# Altium schematic symbol library jlcpcb_2025_04_capacitors_extended_0603.schlib: 3668 symbols (part 19 of 20) (continued)
## TCC0603X5R185K160CT
designator C?  Capacitance: 1.8uF  (hidden comment: *)
Capacitor, Ceramic (MLCC), 1.8uF, ±10%, 16V, X5R, ±10%, SMD 0603; Manufacturer: CCTC; Manufacturer Part Number: TCC0603X5R185K160CT; Package Size: 0603; JLCPCB Basic Part: No; JLCPCB Part Number: C7393894; Supplier 1: LCSC; Category: Capacitors - MLCC; Supplier Part Number 1: C7393894; Tolerance: ±10%; Voltage Rating: 16V; Temperature Coefficient: X5R; RoHS: Yes; ComponentLink1Description: Datasheet; ComponentLink1URL: https://wmsc.lcsc.com/wmsc/upload/file/pdf/v2/lcsc/2306211554_CCTC-TCC0603X5R185K160CT_C7393894.pdf; ComponentLink2Description: JLCPCB Part URL; ComponentLink2URL: https://jlcpcb.com/partdetail/C7393894; ComponentLink3Description: LCSC Part URL; ComponentLink3URL: https://lcsc.com/product-detail/Multilayer-Ceramic-Capacitors-MLCC---SMD-SMT_CCTC-CCTC-TCC0603X5R185K160CT_C7393894.html
footprint CAP-0603 (0603 (1608M) Capacitor)
pins: 1, 2

## TCC0603X5R224M250CT
designator C?  Capacitance: 220nF  (hidden comment: *)
Capacitor, Ceramic (MLCC), 220nF, ±20%, 25V, X5R, ±20%, SMD 0603; Manufacturer: CCTC; Manufacturer Part Number: TCC0603X5R224M250CT; Package Size: 0603; JLCPCB Basic Part: No; JLCPCB Part Number: C713508; Supplier 1: LCSC; Category: Capacitors - MLCC; Supplier Part Number 1: C713508; Tolerance: ±20%; Voltage Rating: 25V; Temperature Coefficient: X5R; RoHS: Yes; ComponentLink1Description: Datasheet; ComponentLink1URL: https://wmsc.lcsc.com/wmsc/upload/file/pdf/v2/lcsc/2304140030_CCTC-TCC0603X5R224M250CT_C713508.pdf; ComponentLink2Description: JLCPCB Part URL; ComponentLink2URL: https://jlcpcb.com/partdetail/C713508; ComponentLink3Description: LCSC Part URL; ComponentLink3URL: https://lcsc.com/product-detail/Multilayer-Ceramic-Capacitors-MLCC---SMD-SMT_CCTC-CCTC-TCC0603X5R224M250CT_C713508.html
footprint CAP-0603 (0603 (1608M) Capacitor)
pins: 1, 2

## TCC0603X5R225K6R3CT
designator C?  Capacitance: 2.2uF  (hidden comment: *)
Capacitor, Ceramic (MLCC), 2.2uF, ±10%, 6.3V, X5R, ±10%, SMD 0603; Manufacturer: CCTC; Manufacturer Part Number: TCC0603X5R225K6R3CT; Package Size: 0603; JLCPCB Basic Part: No; JLCPCB Part Number: C380322; Supplier 1: LCSC; Category: Capacitors - MLCC; Supplier Part Number 1: C380322; Tolerance: ±10%; Voltage Rating: 6.3V; Temperature Coefficient: X5R; RoHS: Yes; ComponentLink1Description: Datasheet; ComponentLink1URL: https://wmsc.lcsc.com/wmsc/upload/file/pdf/v2/lcsc/2304140030_CCTC-TCC0603X5R225K6R3CT_C380322.pdf; ComponentLink2Description: JLCPCB Part URL; ComponentLink2URL: https://jlcpcb.com/partdetail/C380322; ComponentLink3Description: LCSC Part URL; ComponentLink3URL: https://lcsc.com/product-detail/Multilayer-Ceramic-Capacitors-MLCC---SMD-SMT_CCTC-CCTC-TCC0603X5R225K6R3CT_C380322.html
footprint CAP-0603 (0603 (1608M) Capacitor)
pins: 1, 2

## TCC0603X5R225K100CT
designator C?  Capacitance: 2.2uF  (hidden comment: *)
Capacitor, Ceramic (MLCC), 2.2uF, ±10%, 10V, X5R, ±10%, SMD 0603; Manufacturer: CCTC; Manufacturer Part Number: TCC0603X5R225K100CT; Package Size: 0603; JLCPCB Basic Part: No; JLCPCB Part Number: C380319; Supplier 1: LCSC; Category: Capacitors - MLCC; Supplier Part Number 1: C380319; Tolerance: ±10%; Voltage Rating: 10V; Temperature Coefficient: X5R; RoHS: Yes; ComponentLink1Description: Datasheet; ComponentLink1URL: https://wmsc.lcsc.com/wmsc/upload/file/pdf/v2/lcsc/2304140030_CCTC-TCC0603X5R225K100CT_C380319.pdf; ComponentLink2Description: JLCPCB Part URL; ComponentLink2URL: https://jlcpcb.com/partdetail/C380319; ComponentLink3Description: LCSC Part URL; ComponentLink3URL: https://lcsc.com/product-detail/Multilayer-Ceramic-Capacitors-MLCC---SMD-SMT_CCTC-CCTC-TCC0603X5R225K100CT_C380319.html
footprint CAP-0603 (0603 (1608M) Capacitor)
pins: 1, 2

## TCC0603X5R225K160CT
designator C?  Capacitance: 2.2uF  (hidden comment: *)
Capacitor, Ceramic (MLCC), 2.2uF, ±10%, 16V, X5R, ±10%, SMD 0603; Manufacturer: CCTC; Manufacturer Part Number: TCC0603X5R225K160CT; Package Size: 0603; JLCPCB Basic Part: No; JLCPCB Part Number: C380320; Supplier 1: LCSC; Category: Capacitors - MLCC; Supplier Part Number 1: C380320; Tolerance: ±10%; Voltage Rating: 16V; Temperature Coefficient: X5R; RoHS: Yes; ComponentLink1Description: Datasheet; ComponentLink1URL: https://wmsc.lcsc.com/wmsc/upload/file/pdf/v2/lcsc/2304140030_CCTC-TCC0603X5R225K160CT_C380320.pdf; ComponentLink2Description: JLCPCB Part URL; ComponentLink2URL: https://jlcpcb.com/partdetail/C380320; ComponentLink3Description: LCSC Part URL; ComponentLink3URL: https://lcsc.com/product-detail/Multilayer-Ceramic-Capacitors-MLCC---SMD-SMT_CCTC-CCTC-TCC0603X5R225K160CT_C380320.html
footprint CAP-0603 (0603 (1608M) Capacitor)
pins: 1, 2

## TCC0603X5R225K250CT
designator C?  Capacitance: 2.2uF  (hidden comment: *)
Capacitor, Ceramic (MLCC), 2.2uF, ±10%, 25V, X5R, ±10%, SMD 0603; Manufacturer: CCTC; Manufacturer Part Number: TCC0603X5R225K250CT; Package Size: 0603; JLCPCB Basic Part: No; JLCPCB Part Number: C380321; Supplier 1: LCSC; Category: Capacitors - MLCC; Supplier Part Number 1: C380321; Tolerance: ±10%; Voltage Rating: 25V; Temperature Coefficient: X5R; RoHS: Yes; ComponentLink1Description: Datasheet; ComponentLink1URL: https://wmsc.lcsc.com/wmsc/upload/file/pdf/v2/lcsc/2304140030_CCTC-TCC0603X5R225K250CT_C380321.pdf; ComponentLink2Description: JLCPCB Part URL; ComponentLink2URL: https://jlcpcb.com/partdetail/C380321; ComponentLink3Description: LCSC Part URL; ComponentLink3URL: https://lcsc.com/product-detail/Multilayer-Ceramic-Capacitors-MLCC---SMD-SMT_CCTC-CCTC-TCC0603X5R225K250CT_C380321.html
footprint CAP-0603 (0603 (1608M) Capacitor)
pins: 1, 2

## TCC0603X5R225M160CT
designator C?  Capacitance: 2.2uF  (hidden comment: *)
Capacitor, Ceramic (MLCC), 2.2uF, ±20%, 16V, X5R, ±20%, SMD 0603; Manufacturer: CCTC; Manufacturer Part Number: TCC0603X5R225M160CT; Package Size: 0603; JLCPCB Basic Part: No; JLCPCB Part Number: C5360777; Supplier 1: LCSC; Category: Capacitors - MLCC; Supplier Part Number 1: C5360777; Tolerance: ±20%; Voltage Rating: 16V; Temperature Coefficient: X5R; RoHS: Yes; ComponentLink1Description: Datasheet; ComponentLink1URL: https://wmsc.lcsc.com/wmsc/upload/file/pdf/v2/lcsc/2302141837_CCTC-TCC0603X5R225M160CT_C5360777.pdf; ComponentLink2Description: JLCPCB Part URL; ComponentLink2URL: https://jlcpcb.com/partdetail/C5360777; ComponentLink3Description: LCSC Part URL; ComponentLink3URL: https://lcsc.com/product-detail/Multilayer-Ceramic-Capacitors-MLCC---SMD-SMT_CCTC-CCTC-TCC0603X5R225M160CT_C5360777.html
footprint CAP-0603 (0603 (1608M) Capacitor)
pins: 1, 2

## TCC0603X5R335M250CT
designator C?  Capacitance: 3.3uF  (hidden comment: *)
Capacitor, Ceramic (MLCC), 3.3uF, 25V, X5R, SMD 0603; Manufacturer: CCTC; Manufacturer Part Number: TCC0603X5R335M250CT; Package Size: 0603; JLCPCB Basic Part: No; JLCPCB Part Number: C5360803; Supplier 1: LCSC; Category: Capacitors - MLCC; Supplier Part Number 1: C5360803; Voltage Rating: 25V; Temperature Coefficient: X5R; RoHS: Yes; ComponentLink1Description: Datasheet; ComponentLink1URL: https://wmsc.lcsc.com/wmsc/upload/file/pdf/v2/lcsc/2302141837_CCTC-TCC0603X5R335M250CT_C5360803.pdf; ComponentLink2Description: JLCPCB Part URL; ComponentLink2URL: https://jlcpcb.com/partdetail/C5360803; ComponentLink3Description: LCSC Part URL; ComponentLink3URL: https://lcsc.com/product-detail/Multilayer-Ceramic-Capacitors-MLCC---SMD-SMT_CCTC-CCTC-TCC0603X5R335M250CT_C5360803.html
footprint CAP-0603 (0603 (1608M) Capacitor)
pins: 1, 2

## TCC0603X5R475K6R3CT
designator C?  Capacitance: 4.7uF  (hidden comment: *)
Capacitor, Ceramic (MLCC), 4.7uF, ±10%, 6.3V, X5R, ±10%, SMD 0603; Manufacturer: CCTC; Manufacturer Part Number: TCC0603X5R475K6R3CT; Package Size: 0603; JLCPCB Basic Part: No; JLCPCB Part Number: C380326; Supplier 1: LCSC; Category: Capacitors - MLCC; Supplier Part Number 1: C380326; Tolerance: ±10%; Voltage Rating: 6.3V; Temperature Coefficient: X5R; RoHS: Yes; ComponentLink1Description: Datasheet; ComponentLink1URL: https://wmsc.lcsc.com/wmsc/upload/file/pdf/v2/lcsc/2304140030_CCTC-TCC0603X5R475K6R3CT_C380326.pdf; ComponentLink2Description: JLCPCB Part URL; ComponentLink2URL: https://jlcpcb.com/partdetail/C380326; ComponentLink3Description: LCSC Part URL; ComponentLink3URL: https://lcsc.com/product-detail/Multilayer-Ceramic-Capacitors-MLCC---SMD-SMT_CCTC-CCTC-TCC0603X5R475K6R3CT_C380326.html
footprint CAP-0603 (0603 (1608M) Capacitor)
pins: 1, 2

## TCC0603X5R475K100CT
designator C?  Capacitance: 4.7uF  (hidden comment: *)
Capacitor, Ceramic (MLCC), 4.7uF, ±10%, 10V, X5R, ±10%, SMD 0603; Manufacturer: CCTC; Manufacturer Part Number: TCC0603X5R475K100CT; Package Size: 0603; JLCPCB Basic Part: No; JLCPCB Part Number: C380324; Supplier 1: LCSC; Category: Capacitors - MLCC; Supplier Part Number 1: C380324; Tolerance: ±10%; Voltage Rating: 10V; Temperature Coefficient: X5R; RoHS: Yes; ComponentLink1Description: Datasheet; ComponentLink1URL: https://wmsc.lcsc.com/wmsc/upload/file/pdf/v2/lcsc/2304140030_CCTC-TCC0603X5R475K100CT_C380324.pdf; ComponentLink2Description: JLCPCB Part URL; ComponentLink2URL: https://jlcpcb.com/partdetail/C380324; ComponentLink3Description: LCSC Part URL; ComponentLink3URL: https://lcsc.com/product-detail/Multilayer-Ceramic-Capacitors-MLCC---SMD-SMT_CCTC-CCTC-TCC0603X5R475K100CT_C380324.html
footprint CAP-0603 (0603 (1608M) Capacitor)
pins: 1, 2

## TCC0603X5R475K160CT
designator C?  Capacitance: 4.7uF  (hidden comment: *)
Capacitor, Ceramic (MLCC), 4.7uF, ±10%, 16V, X5R, ±10%, SMD 0603; Manufacturer: CCTC; Manufacturer Part Number: TCC0603X5R475K160CT; Package Size: 0603; JLCPCB Basic Part: No; JLCPCB Part Number: C380325; Supplier 1: LCSC; Category: Capacitors - MLCC; Supplier Part Number 1: C380325; Tolerance: ±10%; Voltage Rating: 16V; Temperature Coefficient: X5R; RoHS: Yes; ComponentLink1Description: Datasheet; ComponentLink1URL: https://wmsc.lcsc.com/wmsc/upload/file/pdf/v2/lcsc/2304140030_CCTC-TCC0603X5R475K160CT_C380325.pdf; ComponentLink2Description: JLCPCB Part URL; ComponentLink2URL: https://jlcpcb.com/partdetail/C380325; ComponentLink3Description: LCSC Part URL; ComponentLink3URL: https://lcsc.com/product-detail/Multilayer-Ceramic-Capacitors-MLCC---SMD-SMT_CCTC-CCTC-TCC0603X5R475K160CT_C380325.html
footprint CAP-0603 (0603 (1608M) Capacitor)
pins: 1, 2

## TCC0603X5R475K250CT
designator C?  Capacitance: 4.7uF  (hidden comment: *)
Capacitor, Ceramic (MLCC), 4.7uF, ±10%, 25V, X5R, ±10%, SMD 0603; Manufacturer: CCTC; Manufacturer Part Number: TCC0603X5R475K250CT; Package Size: 0603; JLCPCB Basic Part: No; JLCPCB Part Number: C5360844; Supplier 1: LCSC; Category: Capacitors - MLCC; Supplier Part Number 1: C5360844; Tolerance: ±10%; Voltage Rating: 25V; Temperature Coefficient: X5R; RoHS: Yes; ComponentLink1Description: Datasheet; ComponentLink1URL: https://wmsc.lcsc.com/wmsc/upload/file/pdf/v2/lcsc/2302141837_CCTC-TCC0603X5R475K250CT_C5360844.pdf; ComponentLink2Description: JLCPCB Part URL; ComponentLink2URL: https://jlcpcb.com/partdetail/C5360844; ComponentLink3Description: LCSC Part URL; ComponentLink3URL: https://lcsc.com/product-detail/Multilayer-Ceramic-Capacitors-MLCC---SMD-SMT_CCTC-CCTC-TCC0603X5R475K250CT_C5360844.html
footprint CAP-0603 (0603 (1608M) Capacitor)
pins: 1, 2

## TCC0603X5R475M160CT
designator C?  Capacitance: 4.7uF  (hidden comment: *)
Capacitor, Ceramic (MLCC), 4.7uF, ±20%, 16V, X5R, ±20%, SMD 0603; Manufacturer: CCTC; Manufacturer Part Number: TCC0603X5R475M160CT; Package Size: 0603; JLCPCB Basic Part: No; JLCPCB Part Number: C7393897; Supplier 1: LCSC; Category: Capacitors - MLCC; Supplier Part Number 1: C7393897; Tolerance: ±20%; Voltage Rating: 16V; Temperature Coefficient: X5R; RoHS: Yes; ComponentLink1Description: Datasheet; ComponentLink1URL: https://wmsc.lcsc.com/wmsc/upload/file/pdf/v2/lcsc/2306211554_CCTC-TCC0603X5R475M160CT_C7393897.pdf; ComponentLink2Description: JLCPCB Part URL; ComponentLink2URL: https://jlcpcb.com/partdetail/C7393897; ComponentLink3Description: LCSC Part URL; ComponentLink3URL: https://lcsc.com/product-detail/Multilayer-Ceramic-Capacitors-MLCC---SMD-SMT_CCTC-CCTC-TCC0603X5R475M160CT_C7393897.html
footprint CAP-0603 (0603 (1608M) Capacitor)
pins: 1, 2

## TCC0603X5R684M160CT
designator C?  Capacitance: 680nF  (hidden comment: *)
Capacitor, Ceramic (MLCC), 680nF, 16V, X5R, SMD 0603; Manufacturer: CCTC; Manufacturer Part Number: TCC0603X5R684M160CT; Package Size: 0603; JLCPCB Basic Part: No; JLCPCB Part Number: C5360787; Supplier 1: LCSC; Category: Capacitors - MLCC; Supplier Part Number 1: C5360787; Voltage Rating: 16V; Temperature Coefficient: X5R; RoHS: Yes; ComponentLink1Description: Datasheet; ComponentLink1URL: https://wmsc.lcsc.com/wmsc/upload/file/pdf/v2/lcsc/2302141837_CCTC-TCC0603X5R684M160CT_C5360787.pdf; ComponentLink2Description: JLCPCB Part URL; ComponentLink2URL: https://jlcpcb.com/partdetail/C5360787; ComponentLink3Description: LCSC Part URL; ComponentLink3URL: https://lcsc.com/product-detail/Multilayer-Ceramic-Capacitors-MLCC---SMD-SMT_CCTC-CCTC-TCC0603X5R684M160CT_C5360787.html
footprint CAP-0603 (0603 (1608M) Capacitor)
pins: 1, 2

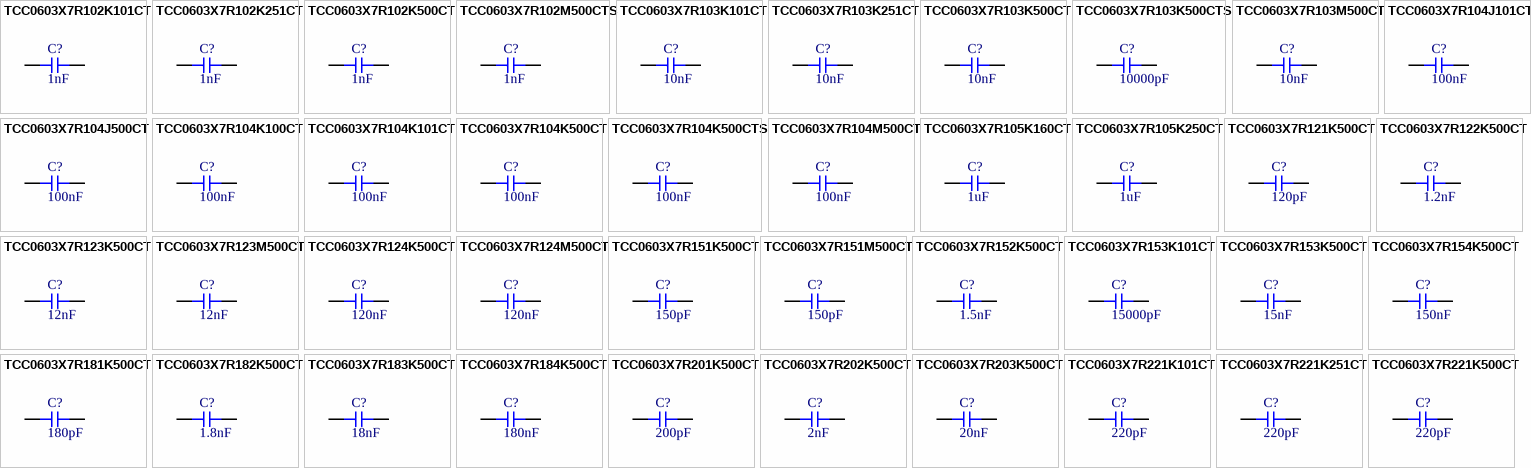
[diagram p87: symbols TCC0603X7R102K101CT to TCC0603X7R221K500CT]

## TCC0603X7R102K101CT
designator C?  Capacitance: 1nF  (hidden comment: *)
Capacitor, Ceramic (MLCC), 1nF, ±10%, 100V, X7R, ±10%, SMD 0603; Manufacturer: CCTC; Manufacturer Part Number: TCC0603X7R102K101CT; Package Size: 0603; JLCPCB Basic Part: No; JLCPCB Part Number: C282513; Supplier 1: LCSC; Category: Capacitors - MLCC; Supplier Part Number 1: C282513; Tolerance: ±10%; Voltage Rating: 100V; Temperature Coefficient: X7R; RoHS: Yes; ComponentLink1Description: Datasheet; ComponentLink1URL: https://wmsc.lcsc.com/wmsc/upload/file/pdf/v2/lcsc/2304140030_CCTC-TCC0603X7R102K101CT_C282513.pdf; ComponentLink2Description: JLCPCB Part URL; ComponentLink2URL: https://jlcpcb.com/partdetail/C282513; ComponentLink3Description: LCSC Part URL; ComponentLink3URL: https://lcsc.com/product-detail/Multilayer-Ceramic-Capacitors-MLCC---SMD-SMT_CCTC-CCTC-TCC0603X7R102K101CT_C282513.html
footprint CAP-0603 (0603 (1608M) Capacitor)
pins: 1, 2

## TCC0603X7R102K251CT
designator C?  Capacitance: 1nF  (hidden comment: *)
Capacitor, Ceramic (MLCC), 1nF, ±10%, 250V, X7R, ±10%, SMD 0603; Manufacturer: CCTC; Manufacturer Part Number: TCC0603X7R102K251CT; Package Size: 0603; JLCPCB Basic Part: No; JLCPCB Part Number: C282514; Supplier 1: LCSC; Category: Capacitors - MLCC; Supplier Part Number 1: C282514; Tolerance: ±10%; Voltage Rating: 250V; Temperature Coefficient: X7R; RoHS: Yes; ComponentLink1Description: Datasheet; ComponentLink1URL: https://wmsc.lcsc.com/wmsc/upload/file/pdf/v2/lcsc/2304140030_CCTC-TCC0603X7R102K251CT_C282514.pdf; ComponentLink2Description: JLCPCB Part URL; ComponentLink2URL: https://jlcpcb.com/partdetail/C282514; ComponentLink3Description: LCSC Part URL; ComponentLink3URL: https://lcsc.com/product-detail/Multilayer-Ceramic-Capacitors-MLCC---SMD-SMT_CCTC-CCTC-TCC0603X7R102K251CT_C282514.html
footprint CAP-0603 (0603 (1608M) Capacitor)
pins: 1, 2

## TCC0603X7R102K500CT
designator C?  Capacitance: 1nF  (hidden comment: *)
Capacitor, Ceramic (MLCC), 1nF, ±10%, 50V, X7R, ±10%, SMD 0603; Manufacturer: CCTC; Manufacturer Part Number: TCC0603X7R102K500CT; Package Size: 0603; JLCPCB Basic Part: No; JLCPCB Part Number: C282515; Supplier 1: LCSC; Category: Capacitors - MLCC; Supplier Part Number 1: C282515; Tolerance: ±10%; Voltage Rating: 50V; Temperature Coefficient: X7R; RoHS: Yes; ComponentLink1Description: Datasheet; ComponentLink1URL: https://wmsc.lcsc.com/wmsc/upload/file/pdf/v2/lcsc/2304140030_CCTC-TCC0603X7R102K500CT_C282515.pdf; ComponentLink2Description: JLCPCB Part URL; ComponentLink2URL: https://jlcpcb.com/partdetail/C282515; ComponentLink3Description: LCSC Part URL; ComponentLink3URL: https://lcsc.com/product-detail/Multilayer-Ceramic-Capacitors-MLCC---SMD-SMT_CCTC-CCTC-TCC0603X7R102K500CT_C282515.html
footprint CAP-0603 (0603 (1608M) Capacitor)
pins: 1, 2

## TCC0603X7R102M500CTS
designator C?  Capacitance: 1nF  (hidden comment: *)
Capacitor, Ceramic (MLCC), 1nF, ±20%, 50V, X7R, ±20%, SMD 0603; Manufacturer: CCTC; Manufacturer Part Number: TCC0603X7R102M500CTS; Package Size: 0603; JLCPCB Basic Part: No; JLCPCB Part Number: C5375733; Supplier 1: LCSC; Category: Capacitors - MLCC; Supplier Part Number 1: C5375733; Tolerance: ±20%; Voltage Rating: 50V; Temperature Coefficient: X7R; RoHS: Yes; ComponentLink1Description: Datasheet; ComponentLink2Description: JLCPCB Part URL; ComponentLink2URL: https://jlcpcb.com/partdetail/C5375733; ComponentLink3Description: LCSC Part URL; ComponentLink3URL: https://lcsc.com/product-detail/Multilayer-Ceramic-Capacitors-MLCC---SMD-SMT_CCTC-CCTC-TCC0603X7R102M500CTS_C5375733.html
footprint CAP-0603 (0603 (1608M) Capacitor)
pins: 1, 2

## TCC0603X7R103K101CT
designator C?  Capacitance: 10nF  (hidden comment: *)
Capacitor, Ceramic (MLCC), 10nF, ±10%, 100V, X7R, ±10%, SMD 0603; Manufacturer: CCTC; Manufacturer Part Number: TCC0603X7R103K101CT; Package Size: 0603; JLCPCB Basic Part: No; JLCPCB Part Number: C282516; Supplier 1: LCSC; Category: Capacitors - MLCC; Supplier Part Number 1: C282516; Tolerance: ±10%; Voltage Rating: 100V; Temperature Coefficient: X7R; RoHS: Yes; ComponentLink1Description: Datasheet; ComponentLink1URL: https://wmsc.lcsc.com/wmsc/upload/file/pdf/v2/lcsc/2304140030_CCTC-TCC0603X7R103K101CT_C282516.pdf; ComponentLink2Description: JLCPCB Part URL; ComponentLink2URL: https://jlcpcb.com/partdetail/C282516; ComponentLink3Description: LCSC Part URL; ComponentLink3URL: https://lcsc.com/product-detail/Multilayer-Ceramic-Capacitors-MLCC---SMD-SMT_CCTC-CCTC-TCC0603X7R103K101CT_C282516.html
footprint CAP-0603 (0603 (1608M) Capacitor)
pins: 1, 2

## TCC0603X7R103K251CT
designator C?  Capacitance: 10nF  (hidden comment: *)
Capacitor, Ceramic (MLCC), 10nF, ±10%, 250V, X7R, ±10%, SMD 0603; Manufacturer: CCTC; Manufacturer Part Number: TCC0603X7R103K251CT; Package Size: 0603; JLCPCB Basic Part: No; JLCPCB Part Number: C282517; Supplier 1: LCSC; Category: Capacitors - MLCC; Supplier Part Number 1: C282517; Tolerance: ±10%; Voltage Rating: 250V; Temperature Coefficient: X7R; RoHS: Yes; ComponentLink1Description: Datasheet; ComponentLink1URL: https://wmsc.lcsc.com/wmsc/upload/file/pdf/v2/lcsc/2304140030_CCTC-TCC0603X7R103K251CT_C282517.pdf; ComponentLink2Description: JLCPCB Part URL; ComponentLink2URL: https://jlcpcb.com/partdetail/C282517; ComponentLink3Description: LCSC Part URL; ComponentLink3URL: https://lcsc.com/product-detail/Multilayer-Ceramic-Capacitors-MLCC---SMD-SMT_CCTC-CCTC-TCC0603X7R103K251CT_C282517.html
footprint CAP-0603 (0603 (1608M) Capacitor)
pins: 1, 2

## TCC0603X7R103K500CT
designator C?  Capacitance: 10nF  (hidden comment: *)
Capacitor, Ceramic (MLCC), 10nF, ±10%, 50V, X7R, ±10%, SMD 0603; Manufacturer: CCTC; Manufacturer Part Number: TCC0603X7R103K500CT; Package Size: 0603; JLCPCB Basic Part: No; JLCPCB Part Number: C309036; Supplier 1: LCSC; Category: Capacitors - MLCC; Supplier Part Number 1: C309036; Tolerance: ±10%; Voltage Rating: 50V; Temperature Coefficient: X7R; RoHS: Yes; ComponentLink1Description: Datasheet; ComponentLink1URL: https://wmsc.lcsc.com/wmsc/upload/file/pdf/v2/lcsc/2304140030_CCTC-TCC0603X7R103K500CT_C309036.pdf; ComponentLink2Description: JLCPCB Part URL; ComponentLink2URL: https://jlcpcb.com/partdetail/C309036; ComponentLink3Description: LCSC Part URL; ComponentLink3URL: https://lcsc.com/product-detail/Multilayer-Ceramic-Capacitors-MLCC---SMD-SMT_CCTC-CCTC-TCC0603X7R103K500CT_C309036.html
footprint CAP-0603 (0603 (1608M) Capacitor)
pins: 1, 2

## TCC0603X7R103K500CTS
designator C?  Capacitance: 10000pF  (hidden comment: *)
Capacitor, Ceramic (MLCC), 10000pF, ±10%, 50V, X7R, ±10%, SMD 0603; Manufacturer: CCTC; Manufacturer Part Number: TCC0603X7R103K500CTS; Package Size: 0603; JLCPCB Basic Part: No; JLCPCB Part Number: C880659; Supplier 1: LCSC; Category: Capacitors - MLCC; Supplier Part Number 1: C880659; Tolerance: ±10%; Voltage Rating: 50V; Temperature Coefficient: X7R; RoHS: Yes; ComponentLink1Description: Datasheet; ComponentLink1URL: https://wmsc.lcsc.com/wmsc/upload/file/pdf/v2/lcsc/2304140030_CCTC-TCC0603X7R103K500CTS_C880659.pdf; ComponentLink2Description: JLCPCB Part URL; ComponentLink2URL: https://jlcpcb.com/partdetail/C880659; ComponentLink3Description: LCSC Part URL; ComponentLink3URL: https://lcsc.com/product-detail/Multilayer-Ceramic-Capacitors-MLCC---SMD-SMT_CCTC-CCTC-TCC0603X7R103K500CTS_C880659.html
footprint CAP-0603 (0603 (1608M) Capacitor)
pins: 1, 2

## TCC0603X7R103M500CT
designator C?  Capacitance: 10nF  (hidden comment: *)
Capacitor, Ceramic (MLCC), 10nF, ±20%, 50V, X7R, ±20%, SMD 0603; Manufacturer: CCTC; Manufacturer Part Number: TCC0603X7R103M500CT; Package Size: 0603; JLCPCB Basic Part: No; JLCPCB Part Number: C376807; Supplier 1: LCSC; Category: Capacitors - MLCC; Supplier Part Number 1: C376807; Tolerance: ±20%; Voltage Rating: 50V; Temperature Coefficient: X7R; RoHS: Yes; ComponentLink1Description: Datasheet; ComponentLink1URL: https://wmsc.lcsc.com/wmsc/upload/file/pdf/v2/lcsc/2304140030_CCTC-TCC0603X7R103M500CT_C376807.pdf; ComponentLink2Description: JLCPCB Part URL; ComponentLink2URL: https://jlcpcb.com/partdetail/C376807; ComponentLink3Description: LCSC Part URL; ComponentLink3URL: https://lcsc.com/product-detail/Multilayer-Ceramic-Capacitors-MLCC---SMD-SMT_CCTC-CCTC-TCC0603X7R103M500CT_C376807.html
footprint CAP-0603 (0603 (1608M) Capacitor)
pins: 1, 2

## TCC0603X7R104J101CT
designator C?  Capacitance: 100nF  (hidden comment: *)
Capacitor, Ceramic (MLCC), 100nF, ±5%, 100V, X7R, ±5%, SMD 0603; Manufacturer: CCTC; Manufacturer Part Number: TCC0603X7R104J101CT; Package Size: 0603; JLCPCB Basic Part: No; JLCPCB Part Number: C18185760; Supplier 1: LCSC; Category: Capacitors - MLCC; Supplier Part Number 1: C18185760; Tolerance: ±5%; Voltage Rating: 100V; Temperature Coefficient: X7R; RoHS: Yes; ComponentLink1Description: Datasheet; ComponentLink1URL: https://wmsc.lcsc.com/wmsc/upload/file/pdf/v2/lcsc/2309181618_CCTC-TCC0603X7R104J101CT_C18185760.pdf; ComponentLink2Description: JLCPCB Part URL; ComponentLink2URL: https://jlcpcb.com/partdetail/C18185760; ComponentLink3Description: LCSC Part URL; ComponentLink3URL: https://lcsc.com/product-detail/Multilayer-Ceramic-Capacitors-MLCC---SMD-SMT_CCTC-CCTC-TCC0603X7R104J101CT_C18185760.html
footprint CAP-0603 (0603 (1608M) Capacitor)
pins: 1, 2

## TCC0603X7R104J500CT
designator C?  Capacitance: 100nF  (hidden comment: *)
Capacitor, Ceramic (MLCC), 100nF, ±5%, 50V, X7R, ±5%, SMD 0603; Manufacturer: CCTC; Manufacturer Part Number: TCC0603X7R104J500CT; Package Size: 0603; JLCPCB Basic Part: No; JLCPCB Part Number: C282518; Supplier 1: LCSC; Category: Capacitors - MLCC; Supplier Part Number 1: C282518; Tolerance: ±5%; Voltage Rating: 50V; Temperature Coefficient: X7R; RoHS: Yes; ComponentLink1Description: Datasheet; ComponentLink1URL: https://wmsc.lcsc.com/wmsc/upload/file/pdf/v2/lcsc/2304140030_CCTC-TCC0603X7R104J500CT_C282518.pdf; ComponentLink2Description: JLCPCB Part URL; ComponentLink2URL: https://jlcpcb.com/partdetail/C282518; ComponentLink3Description: LCSC Part URL; ComponentLink3URL: https://lcsc.com/product-detail/Multilayer-Ceramic-Capacitors-MLCC---SMD-SMT_CCTC-CCTC-TCC0603X7R104J500CT_C282518.html
footprint CAP-0603 (0603 (1608M) Capacitor)
pins: 1, 2

## TCC0603X7R104K100CT
designator C?  Capacitance: 100nF  (hidden comment: *)
Capacitor, Ceramic (MLCC), 100nF, ±10%, 10V, X7R, ±10%, SMD 0603; Manufacturer: CCTC; Manufacturer Part Number: TCC0603X7R104K100CT; Package Size: 0603; JLCPCB Basic Part: No; JLCPCB Part Number: C2932182; Supplier 1: LCSC; Category: Capacitors - MLCC; Supplier Part Number 1: C2932182; Tolerance: ±10%; Voltage Rating: 10V; Temperature Coefficient: X7R; RoHS: Yes; ComponentLink1Description: Datasheet; ComponentLink1URL: https://wmsc.lcsc.com/wmsc/upload/file/pdf/v2/lcsc/2201121530_CCTC-TCC0603X7R104K100CT_C2932182.pdf; ComponentLink2Description: JLCPCB Part URL; ComponentLink2URL: https://jlcpcb.com/partdetail/C2932182; ComponentLink3Description: LCSC Part URL; ComponentLink3URL: https://lcsc.com/product-detail/Multilayer-Ceramic-Capacitors-MLCC---SMD-SMT_CCTC-CCTC-TCC0603X7R104K100CT_C2932182.html
footprint CAP-0603 (0603 (1608M) Capacitor)
pins: 1, 2

## TCC0603X7R104K101CT
designator C?  Capacitance: 100nF  (hidden comment: *)
Capacitor, Ceramic (MLCC), 100nF, ±10%, 100V, X7R, ±10%, SMD 0603; Manufacturer: CCTC; Manufacturer Part Number: TCC0603X7R104K101CT; Package Size: 0603; JLCPCB Basic Part: No; JLCPCB Part Number: C696916; Supplier 1: LCSC; Category: Capacitors - MLCC; Supplier Part Number 1: C696916; Tolerance: ±10%; Voltage Rating: 100V; Temperature Coefficient: X7R; RoHS: Yes; ComponentLink1Description: Datasheet; ComponentLink1URL: https://wmsc.lcsc.com/wmsc/upload/file/pdf/v2/lcsc/2304140030_CCTC-TCC0603X7R104K101CT_C696916.pdf; ComponentLink2Description: JLCPCB Part URL; ComponentLink2URL: https://jlcpcb.com/partdetail/C696916; ComponentLink3Description: LCSC Part URL; ComponentLink3URL: https://lcsc.com/product-detail/Multilayer-Ceramic-Capacitors-MLCC---SMD-SMT_CCTC-CCTC-TCC0603X7R104K101CT_C696916.html
footprint CAP-0603 (0603 (1608M) Capacitor)
pins: 1, 2

## TCC0603X7R104K500CT
designator C?  Capacitance: 100nF  (hidden comment: *)
Capacitor, Ceramic (MLCC), 100nF, ±10%, 50V, X7R, ±10%, SMD 0603; Manufacturer: CCTC; Manufacturer Part Number: TCC0603X7R104K500CT; Package Size: 0603; JLCPCB Basic Part: No; JLCPCB Part Number: C282519; Supplier 1: LCSC; Category: Capacitors - MLCC; Supplier Part Number 1: C282519; Tolerance: ±10%; Voltage Rating: 50V; Temperature Coefficient: X7R; RoHS: Yes; ComponentLink1Description: Datasheet; ComponentLink1URL: https://wmsc.lcsc.com/wmsc/upload/file/pdf/v2/lcsc/2304140030_CCTC-TCC0603X7R104K500CT_C282519.pdf; ComponentLink2Description: JLCPCB Part URL; ComponentLink2URL: https://jlcpcb.com/partdetail/C282519; ComponentLink3Description: LCSC Part URL; ComponentLink3URL: https://lcsc.com/product-detail/Multilayer-Ceramic-Capacitors-MLCC---SMD-SMT_CCTC-CCTC-TCC0603X7R104K500CT_C282519.html
footprint CAP-0603 (0603 (1608M) Capacitor)
pins: 1, 2

## TCC0603X7R104K500CTS
designator C?  Capacitance: 100nF  (hidden comment: *)
Capacitor, Ceramic (MLCC), 100nF, ±10%, 50V, X7R, ±10%, SMD 0603; Manufacturer: CCTC; Manufacturer Part Number: TCC0603X7R104K500CTS; Package Size: 0603; JLCPCB Basic Part: No; JLCPCB Part Number: C282520; Supplier 1: LCSC; Category: Capacitors - MLCC; Supplier Part Number 1: C282520; Tolerance: ±10%; Voltage Rating: 50V; Temperature Coefficient: X7R; RoHS: Yes; ComponentLink1Description: Datasheet; ComponentLink1URL: https://wmsc.lcsc.com/wmsc/upload/file/pdf/v2/lcsc/2304140030_CCTC-TCC0603X7R104K500CTS_C282520.pdf; ComponentLink2Description: JLCPCB Part URL; ComponentLink2URL: https://jlcpcb.com/partdetail/C282520; ComponentLink3Description: LCSC Part URL; ComponentLink3URL: https://lcsc.com/product-detail/Multilayer-Ceramic-Capacitors-MLCC---SMD-SMT_CCTC-CCTC-TCC0603X7R104K500CTS_C282520.html
footprint CAP-0603 (0603 (1608M) Capacitor)
pins: 1, 2

## TCC0603X7R104M500CT
designator C?  Capacitance: 100nF  (hidden comment: *)
Capacitor, Ceramic (MLCC), 100nF, ±20%, 50V, X7R, ±20%, SMD 0603; Manufacturer: CCTC; Manufacturer Part Number: TCC0603X7R104M500CT; Package Size: 0603; JLCPCB Basic Part: No; JLCPCB Part Number: C282670; Supplier 1: LCSC; Category: Capacitors - MLCC; Supplier Part Number 1: C282670; Tolerance: ±20%; Voltage Rating: 50V; Temperature Coefficient: X7R; RoHS: Yes; ComponentLink1Description: Datasheet; ComponentLink1URL: https://wmsc.lcsc.com/wmsc/upload/file/pdf/v2/lcsc/2304140030_CCTC-TCC0603X7R104M500CT_C282670.pdf; ComponentLink2Description: JLCPCB Part URL; ComponentLink2URL: https://jlcpcb.com/partdetail/C282670; ComponentLink3Description: LCSC Part URL; ComponentLink3URL: https://lcsc.com/product-detail/Multilayer-Ceramic-Capacitors-MLCC---SMD-SMT_CCTC-CCTC-TCC0603X7R104M500CT_C282670.html
footprint CAP-0603 (0603 (1608M) Capacitor)
pins: 1, 2

## TCC0603X7R105K160CT
designator C?  Capacitance: 1uF  (hidden comment: *)
Capacitor, Ceramic (MLCC), 1uF, ±10%, 16V, X7R, ±10%, SMD 0603; Manufacturer: CCTC; Manufacturer Part Number: TCC0603X7R105K160CT; Package Size: 0603; JLCPCB Basic Part: No; JLCPCB Part Number: C380327; Supplier 1: LCSC; Category: Capacitors - MLCC; Supplier Part Number 1: C380327; Tolerance: ±10%; Voltage Rating: 16V; Temperature Coefficient: X7R; RoHS: Yes; ComponentLink1Description: Datasheet; ComponentLink1URL: https://wmsc.lcsc.com/wmsc/upload/file/pdf/v2/lcsc/2304140030_CCTC-TCC0603X7R105K160CT_C380327.pdf; ComponentLink2Description: JLCPCB Part URL; ComponentLink2URL: https://jlcpcb.com/partdetail/C380327; ComponentLink3Description: LCSC Part URL; ComponentLink3URL: https://lcsc.com/product-detail/Multilayer-Ceramic-Capacitors-MLCC---SMD-SMT_CCTC-CCTC-TCC0603X7R105K160CT_C380327.html
footprint CAP-0603 (0603 (1608M) Capacitor)
pins: 1, 2

## TCC0603X7R105K250CT
designator C?  Capacitance: 1uF  (hidden comment: *)
Capacitor, Ceramic (MLCC), 1uF, ±10%, 25V, X7R, ±10%, SMD 0603; Manufacturer: CCTC; Manufacturer Part Number: TCC0603X7R105K250CT; Package Size: 0603; JLCPCB Basic Part: No; JLCPCB Part Number: C380328; Supplier 1: LCSC; Category: Capacitors - MLCC; Supplier Part Number 1: C380328; Tolerance: ±10%; Voltage Rating: 25V; Temperature Coefficient: X7R; RoHS: Yes; ComponentLink1Description: Datasheet; ComponentLink1URL: https://wmsc.lcsc.com/wmsc/upload/file/pdf/v2/lcsc/2304140030_CCTC-TCC0603X7R105K250CT_C380328.pdf; ComponentLink2Description: JLCPCB Part URL; ComponentLink2URL: https://jlcpcb.com/partdetail/C380328; ComponentLink3Description: LCSC Part URL; ComponentLink3URL: https://lcsc.com/product-detail/Multilayer-Ceramic-Capacitors-MLCC---SMD-SMT_CCTC-CCTC-TCC0603X7R105K250CT_C380328.html
footprint CAP-0603 (0603 (1608M) Capacitor)
pins: 1, 2

## TCC0603X7R121K500CT
designator C?  Capacitance: 120pF  (hidden comment: *)
Capacitor, Ceramic (MLCC), 120pF, ±10%, 50V, X7R, ±10%, SMD 0603; Manufacturer: CCTC; Manufacturer Part Number: TCC0603X7R121K500CT; Package Size: 0603; JLCPCB Basic Part: No; JLCPCB Part Number: C282671; Supplier 1: LCSC; Category: Capacitors - MLCC; Supplier Part Number 1: C282671; Tolerance: ±10%; Voltage Rating: 50V; Temperature Coefficient: X7R; RoHS: Yes; ComponentLink1Description: Datasheet; ComponentLink1URL: https://wmsc.lcsc.com/wmsc/upload/file/pdf/v2/lcsc/2304140030_CCTC-TCC0603X7R121K500CT_C282671.pdf; ComponentLink2Description: JLCPCB Part URL; ComponentLink2URL: https://jlcpcb.com/partdetail/C282671; ComponentLink3Description: LCSC Part URL; ComponentLink3URL: https://lcsc.com/product-detail/Multilayer-Ceramic-Capacitors-MLCC---SMD-SMT_CCTC-CCTC-TCC0603X7R121K500CT_C282671.html
footprint CAP-0603 (0603 (1608M) Capacitor)
pins: 1, 2

## TCC0603X7R122K500CT
designator C?  Capacitance: 1.2nF  (hidden comment: *)
Capacitor, Ceramic (MLCC), 1.2nF, ±10%, 50V, X7R, ±10%, SMD 0603; Manufacturer: CCTC; Manufacturer Part Number: TCC0603X7R122K500CT; Package Size: 0603; JLCPCB Basic Part: No; JLCPCB Part Number: C376808; Supplier 1: LCSC; Category: Capacitors - MLCC; Supplier Part Number 1: C376808; Tolerance: ±10%; Voltage Rating: 50V; Temperature Coefficient: X7R; RoHS: Yes; ComponentLink1Description: Datasheet; ComponentLink1URL: https://wmsc.lcsc.com/wmsc/upload/file/pdf/v2/lcsc/2304140030_CCTC-TCC0603X7R122K500CT_C376808.pdf; ComponentLink2Description: JLCPCB Part URL; ComponentLink2URL: https://jlcpcb.com/partdetail/C376808; ComponentLink3Description: LCSC Part URL; ComponentLink3URL: https://lcsc.com/product-detail/Multilayer-Ceramic-Capacitors-MLCC---SMD-SMT_CCTC-CCTC-TCC0603X7R122K500CT_C376808.html
footprint CAP-0603 (0603 (1608M) Capacitor)
pins: 1, 2

## TCC0603X7R123K500CT
designator C?  Capacitance: 12nF  (hidden comment: *)
Capacitor, Ceramic (MLCC), 12nF, ±10%, 50V, X7R, ±10%, SMD 0603; Manufacturer: CCTC; Manufacturer Part Number: TCC0603X7R123K500CT; Package Size: 0603; JLCPCB Basic Part: No; JLCPCB Part Number: C376809; Supplier 1: LCSC; Category: Capacitors - MLCC; Supplier Part Number 1: C376809; Tolerance: ±10%; Voltage Rating: 50V; Temperature Coefficient: X7R; RoHS: Yes; ComponentLink1Description: Datasheet; ComponentLink1URL: https://wmsc.lcsc.com/wmsc/upload/file/pdf/v2/lcsc/2304140030_CCTC-TCC0603X7R123K500CT_C376809.pdf; ComponentLink2Description: JLCPCB Part URL; ComponentLink2URL: https://jlcpcb.com/partdetail/C376809; ComponentLink3Description: LCSC Part URL; ComponentLink3URL: https://lcsc.com/product-detail/Multilayer-Ceramic-Capacitors-MLCC---SMD-SMT_CCTC-CCTC-TCC0603X7R123K500CT_C376809.html
footprint CAP-0603 (0603 (1608M) Capacitor)
pins: 1, 2

## TCC0603X7R123M500CT
designator C?  Capacitance: 12nF  (hidden comment: *)
Capacitor, Ceramic (MLCC), 12nF, ±20%, 50V, X7R, ±20%, SMD 0603; Manufacturer: CCTC; Manufacturer Part Number: TCC0603X7R123M500CT; Package Size: 0603; JLCPCB Basic Part: No; JLCPCB Part Number: C7393900; Supplier 1: LCSC; Category: Capacitors - MLCC; Supplier Part Number 1: C7393900; Tolerance: ±20%; Voltage Rating: 50V; Temperature Coefficient: X7R; RoHS: Yes; ComponentLink1Description: Datasheet; ComponentLink1URL: https://wmsc.lcsc.com/wmsc/upload/file/pdf/v2/lcsc/2306211554_CCTC-TCC0603X7R123M500CT_C7393900.pdf; ComponentLink2Description: JLCPCB Part URL; ComponentLink2URL: https://jlcpcb.com/partdetail/C7393900; ComponentLink3Description: LCSC Part URL; ComponentLink3URL: https://lcsc.com/product-detail/Multilayer-Ceramic-Capacitors-MLCC---SMD-SMT_CCTC-CCTC-TCC0603X7R123M500CT_C7393900.html
footprint CAP-0603 (0603 (1608M) Capacitor)
pins: 1, 2

## TCC0603X7R124K500CT
designator C?  Capacitance: 120nF  (hidden comment: *)
Capacitor, Ceramic (MLCC), 120nF, ±10%, 50V, X7R, ±10%, SMD 0603; Manufacturer: CCTC; Manufacturer Part Number: TCC0603X7R124K500CT; Package Size: 0603; JLCPCB Basic Part: No; JLCPCB Part Number: C282672; Supplier 1: LCSC; Category: Capacitors - MLCC; Supplier Part Number 1: C282672; Tolerance: ±10%; Voltage Rating: 50V; Temperature Coefficient: X7R; RoHS: Yes; ComponentLink1Description: Datasheet; ComponentLink1URL: https://wmsc.lcsc.com/wmsc/upload/file/pdf/v2/lcsc/2304140030_CCTC-TCC0603X7R124K500CT_C282672.pdf; ComponentLink2Description: JLCPCB Part URL; ComponentLink2URL: https://jlcpcb.com/partdetail/C282672; ComponentLink3Description: LCSC Part URL; ComponentLink3URL: https://lcsc.com/product-detail/Multilayer-Ceramic-Capacitors-MLCC---SMD-SMT_CCTC-CCTC-TCC0603X7R124K500CT_C282672.html
footprint CAP-0603 (0603 (1608M) Capacitor)
pins: 1, 2

## TCC0603X7R124M500CT
designator C?  Capacitance: 120nF  (hidden comment: *)
Capacitor, Ceramic (MLCC), 120nF, ±20%, 50V, X7R, ±20%, SMD 0603; Manufacturer: CCTC; Manufacturer Part Number: TCC0603X7R124M500CT; Package Size: 0603; JLCPCB Basic Part: No; JLCPCB Part Number: C376810; Supplier 1: LCSC; Category: Capacitors - MLCC; Supplier Part Number 1: C376810; Tolerance: ±20%; Voltage Rating: 50V; Temperature Coefficient: X7R; RoHS: Yes; ComponentLink1Description: Datasheet; ComponentLink1URL: https://wmsc.lcsc.com/wmsc/upload/file/pdf/v2/lcsc/2304140030_CCTC-TCC0603X7R124M500CT_C376810.pdf; ComponentLink2Description: JLCPCB Part URL; ComponentLink2URL: https://jlcpcb.com/partdetail/C376810; ComponentLink3Description: LCSC Part URL; ComponentLink3URL: https://lcsc.com/product-detail/Multilayer-Ceramic-Capacitors-MLCC---SMD-SMT_CCTC-CCTC-TCC0603X7R124M500CT_C376810.html
footprint CAP-0603 (0603 (1608M) Capacitor)
pins: 1, 2

## TCC0603X7R151K500CT
designator C?  Capacitance: 150pF  (hidden comment: *)
Capacitor, Ceramic (MLCC), 150pF, ±10%, 50V, X7R, ±10%, SMD 0603; Manufacturer: CCTC; Manufacturer Part Number: TCC0603X7R151K500CT; Package Size: 0603; JLCPCB Basic Part: No; JLCPCB Part Number: C376811; Supplier 1: LCSC; Category: Capacitors - MLCC; Supplier Part Number 1: C376811; Tolerance: ±10%; Voltage Rating: 50V; Temperature Coefficient: X7R; RoHS: Yes; ComponentLink1Description: Datasheet; ComponentLink1URL: https://wmsc.lcsc.com/wmsc/upload/file/pdf/v2/lcsc/2304140030_CCTC-TCC0603X7R151K500CT_C376811.pdf; ComponentLink2Description: JLCPCB Part URL; ComponentLink2URL: https://jlcpcb.com/partdetail/C376811; ComponentLink3Description: LCSC Part URL; ComponentLink3URL: https://lcsc.com/product-detail/Multilayer-Ceramic-Capacitors-MLCC---SMD-SMT_CCTC-CCTC-TCC0603X7R151K500CT_C376811.html
footprint CAP-0603 (0603 (1608M) Capacitor)
pins: 1, 2

## TCC0603X7R151M500CT
designator C?  Capacitance: 150pF  (hidden comment: *)
Capacitor, Ceramic (MLCC), 150pF, ±20%, 50V, X7R, ±20%, SMD 0603; Manufacturer: CCTC; Manufacturer Part Number: TCC0603X7R151M500CT; Package Size: 0603; JLCPCB Basic Part: No; JLCPCB Part Number: C376812; Supplier 1: LCSC; Category: Capacitors - MLCC; Supplier Part Number 1: C376812; Tolerance: ±20%; Voltage Rating: 50V; Temperature Coefficient: X7R; RoHS: Yes; ComponentLink1Description: Datasheet; ComponentLink1URL: https://wmsc.lcsc.com/wmsc/upload/file/pdf/v2/lcsc/2304140030_CCTC-TCC0603X7R151M500CT_C376812.pdf; ComponentLink2Description: JLCPCB Part URL; ComponentLink2URL: https://jlcpcb.com/partdetail/C376812; ComponentLink3Description: LCSC Part URL; ComponentLink3URL: https://lcsc.com/product-detail/Multilayer-Ceramic-Capacitors-MLCC---SMD-SMT_CCTC-CCTC-TCC0603X7R151M500CT_C376812.html
footprint CAP-0603 (0603 (1608M) Capacitor)
pins: 1, 2

## TCC0603X7R152K500CT
designator C?  Capacitance: 1.5nF  (hidden comment: *)
Capacitor, Ceramic (MLCC), 1.5nF, ±10%, 50V, X7R, ±10%, SMD 0603; Manufacturer: CCTC; Manufacturer Part Number: TCC0603X7R152K500CT; Package Size: 0603; JLCPCB Basic Part: No; JLCPCB Part Number: C282673; Supplier 1: LCSC; Category: Capacitors - MLCC; Supplier Part Number 1: C282673; Tolerance: ±10%; Voltage Rating: 50V; Temperature Coefficient: X7R; RoHS: Yes; ComponentLink1Description: Datasheet; ComponentLink1URL: https://wmsc.lcsc.com/wmsc/upload/file/pdf/v2/lcsc/2304140030_CCTC-TCC0603X7R152K500CT_C282673.pdf; ComponentLink2Description: JLCPCB Part URL; ComponentLink2URL: https://jlcpcb.com/partdetail/C282673; ComponentLink3Description: LCSC Part URL; ComponentLink3URL: https://lcsc.com/product-detail/Multilayer-Ceramic-Capacitors-MLCC---SMD-SMT_CCTC-CCTC-TCC0603X7R152K500CT_C282673.html
footprint CAP-0603 (0603 (1608M) Capacitor)
pins: 1, 2

## TCC0603X7R153K101CT
designator C?  Capacitance: 15000pF  (hidden comment: *)
Capacitor, Ceramic (MLCC), 15000pF, ±10%, 100V, X7R, ±10%, SMD 0603; Manufacturer: CCTC; Manufacturer Part Number: TCC0603X7R153K101CT; Package Size: 0603; JLCPCB Basic Part: No; JLCPCB Part Number: C2833636; Supplier 1: LCSC; Category: Capacitors - MLCC; Supplier Part Number 1: C2833636; Tolerance: ±10%; Voltage Rating: 100V; Temperature Coefficient: X7R; RoHS: Yes; ComponentLink1Description: Datasheet; ComponentLink1URL: https://wmsc.lcsc.com/wmsc/upload/file/pdf/v2/lcsc/2105241436_CCTC-TCC0603X7R153K101CT_C2833636.pdf; ComponentLink2Description: JLCPCB Part URL; ComponentLink2URL: https://jlcpcb.com/partdetail/C2833636; ComponentLink3Description: LCSC Part URL; ComponentLink3URL: https://lcsc.com/product-detail/Multilayer-Ceramic-Capacitors-MLCC---SMD-SMT_CCTC-CCTC-TCC0603X7R153K101CT_C2833636.html
footprint CAP-0603 (0603 (1608M) Capacitor)
pins: 1, 2

## TCC0603X7R153K500CT
designator C?  Capacitance: 15nF  (hidden comment: *)
Capacitor, Ceramic (MLCC), 15nF, ±10%, 50V, X7R, ±10%, SMD 0603; Manufacturer: CCTC; Manufacturer Part Number: TCC0603X7R153K500CT; Package Size: 0603; JLCPCB Basic Part: No; JLCPCB Part Number: C376813; Supplier 1: LCSC; Category: Capacitors - MLCC; Supplier Part Number 1: C376813; Tolerance: ±10%; Voltage Rating: 50V; Temperature Coefficient: X7R; RoHS: Yes; ComponentLink1Description: Datasheet; ComponentLink1URL: https://wmsc.lcsc.com/wmsc/upload/file/pdf/v2/lcsc/2304140030_CCTC-TCC0603X7R153K500CT_C376813.pdf; ComponentLink2Description: JLCPCB Part URL; ComponentLink2URL: https://jlcpcb.com/partdetail/C376813; ComponentLink3Description: LCSC Part URL; ComponentLink3URL: https://lcsc.com/product-detail/Multilayer-Ceramic-Capacitors-MLCC---SMD-SMT_CCTC-CCTC-TCC0603X7R153K500CT_C376813.html
footprint CAP-0603 (0603 (1608M) Capacitor)
pins: 1, 2

## TCC0603X7R154K500CT
designator C?  Capacitance: 150nF  (hidden comment: *)
Capacitor, Ceramic (MLCC), 150nF, ±10%, 50V, X7R, ±10%, SMD 0603; Manufacturer: CCTC; Manufacturer Part Number: TCC0603X7R154K500CT; Package Size: 0603; JLCPCB Basic Part: No; JLCPCB Part Number: C282674; Supplier 1: LCSC; Category: Capacitors - MLCC; Supplier Part Number 1: C282674; Tolerance: ±10%; Voltage Rating: 50V; Temperature Coefficient: X7R; RoHS: Yes; ComponentLink1Description: Datasheet; ComponentLink1URL: https://wmsc.lcsc.com/wmsc/upload/file/pdf/v2/lcsc/2304140030_CCTC-TCC0603X7R154K500CT_C282674.pdf; ComponentLink2Description: JLCPCB Part URL; ComponentLink2URL: https://jlcpcb.com/partdetail/C282674; ComponentLink3Description: LCSC Part URL; ComponentLink3URL: https://lcsc.com/product-detail/Multilayer-Ceramic-Capacitors-MLCC---SMD-SMT_CCTC-CCTC-TCC0603X7R154K500CT_C282674.html
footprint CAP-0603 (0603 (1608M) Capacitor)
pins: 1, 2

## TCC0603X7R181K500CT
designator C?  Capacitance: 180pF  (hidden comment: *)
Capacitor, Ceramic (MLCC), 180pF, ±10%, 50V, X7R, ±10%, SMD 0603; Manufacturer: CCTC; Manufacturer Part Number: TCC0603X7R181K500CT; Package Size: 0603; JLCPCB Basic Part: No; JLCPCB Part Number: C376815; Supplier 1: LCSC; Category: Capacitors - MLCC; Supplier Part Number 1: C376815; Tolerance: ±10%; Voltage Rating: 50V; Temperature Coefficient: X7R; RoHS: Yes; ComponentLink1Description: Datasheet; ComponentLink1URL: https://wmsc.lcsc.com/wmsc/upload/file/pdf/v2/lcsc/2304140030_CCTC-TCC0603X7R181K500CT_C376815.pdf; ComponentLink2Description: JLCPCB Part URL; ComponentLink2URL: https://jlcpcb.com/partdetail/C376815; ComponentLink3Description: LCSC Part URL; ComponentLink3URL: https://lcsc.com/product-detail/Multilayer-Ceramic-Capacitors-MLCC---SMD-SMT_CCTC-CCTC-TCC0603X7R181K500CT_C376815.html
footprint CAP-0603 (0603 (1608M) Capacitor)
pins: 1, 2

## TCC0603X7R182K500CT
designator C?  Capacitance: 1.8nF  (hidden comment: *)
Capacitor, Ceramic (MLCC), 1.8nF, ±10%, 50V, X7R, ±10%, SMD 0603; Manufacturer: CCTC; Manufacturer Part Number: TCC0603X7R182K500CT; Package Size: 0603; JLCPCB Basic Part: No; JLCPCB Part Number: C376816; Supplier 1: LCSC; Category: Capacitors - MLCC; Supplier Part Number 1: C376816; Tolerance: ±10%; Voltage Rating: 50V; Temperature Coefficient: X7R; RoHS: Yes; ComponentLink1Description: Datasheet; ComponentLink1URL: https://wmsc.lcsc.com/wmsc/upload/file/pdf/v2/lcsc/2304140030_CCTC-TCC0603X7R182K500CT_C376816.pdf; ComponentLink2Description: JLCPCB Part URL; ComponentLink2URL: https://jlcpcb.com/partdetail/C376816; ComponentLink3Description: LCSC Part URL; ComponentLink3URL: https://lcsc.com/product-detail/Multilayer-Ceramic-Capacitors-MLCC---SMD-SMT_CCTC-CCTC-TCC0603X7R182K500CT_C376816.html
footprint CAP-0603 (0603 (1608M) Capacitor)
pins: 1, 2

## TCC0603X7R183K500CT
designator C?  Capacitance: 18nF  (hidden comment: *)
Capacitor, Ceramic (MLCC), 18nF, ±10%, 50V, X7R, ±10%, SMD 0603; Manufacturer: CCTC; Manufacturer Part Number: TCC0603X7R183K500CT; Package Size: 0603; JLCPCB Basic Part: No; JLCPCB Part Number: C282675; Supplier 1: LCSC; Category: Capacitors - MLCC; Supplier Part Number 1: C282675; Tolerance: ±10%; Voltage Rating: 50V; Temperature Coefficient: X7R; RoHS: Yes; ComponentLink1Description: Datasheet; ComponentLink1URL: https://wmsc.lcsc.com/wmsc/upload/file/pdf/v2/lcsc/2304140030_CCTC-TCC0603X7R183K500CT_C282675.pdf; ComponentLink2Description: JLCPCB Part URL; ComponentLink2URL: https://jlcpcb.com/partdetail/C282675; ComponentLink3Description: LCSC Part URL; ComponentLink3URL: https://lcsc.com/product-detail/Multilayer-Ceramic-Capacitors-MLCC---SMD-SMT_CCTC-CCTC-TCC0603X7R183K500CT_C282675.html
footprint CAP-0603 (0603 (1608M) Capacitor)
pins: 1, 2

## TCC0603X7R184K500CT
designator C?  Capacitance: 180nF  (hidden comment: *)
Capacitor, Ceramic (MLCC), 180nF, ±10%, 50V, ±10%, SMD 0603; Manufacturer: CCTC; Manufacturer Part Number: TCC0603X7R184K500CT; Package Size: 0603; JLCPCB Basic Part: No; JLCPCB Part Number: C2760543; Supplier 1: LCSC; Category: Capacitors - MLCC; Supplier Part Number 1: C2760543; Tolerance: ±10%; Voltage Rating: 50V; RoHS: Yes; ComponentLink1Description: Datasheet; ComponentLink1URL: https://wmsc.lcsc.com/wmsc/upload/file/pdf/v2/lcsc/2304140030_CCTC-TCC0603X7R184K500CT_C2760543.pdf; ComponentLink2Description: JLCPCB Part URL; ComponentLink2URL: https://jlcpcb.com/partdetail/C2760543; ComponentLink3Description: LCSC Part URL; ComponentLink3URL: https://lcsc.com/product-detail/Multilayer-Ceramic-Capacitors-MLCC---SMD-SMT_CCTC-CCTC-TCC0603X7R184K500CT_C2760543.html
footprint CAP-0603 (0603 (1608M) Capacitor)
pins: 1, 2

## TCC0603X7R201K500CT
designator C?  Capacitance: 200pF  (hidden comment: *)
Capacitor, Ceramic (MLCC), 200pF, ±10%, 50V, X7R, ±10%, SMD 0603; Manufacturer: CCTC; Manufacturer Part Number: TCC0603X7R201K500CT; Package Size: 0603; JLCPCB Basic Part: No; JLCPCB Part Number: C376817; Supplier 1: LCSC; Category: Capacitors - MLCC; Supplier Part Number 1: C376817; Tolerance: ±10%; Voltage Rating: 50V; Temperature Coefficient: X7R; RoHS: Yes; ComponentLink1Description: Datasheet; ComponentLink1URL: https://wmsc.lcsc.com/wmsc/upload/file/pdf/v2/lcsc/2304140030_CCTC-TCC0603X7R201K500CT_C376817.pdf; ComponentLink2Description: JLCPCB Part URL; ComponentLink2URL: https://jlcpcb.com/partdetail/C376817; ComponentLink3Description: LCSC Part URL; ComponentLink3URL: https://lcsc.com/product-detail/Multilayer-Ceramic-Capacitors-MLCC---SMD-SMT_CCTC-CCTC-TCC0603X7R201K500CT_C376817.html
footprint CAP-0603 (0603 (1608M) Capacitor)
pins: 1, 2